# Altium footprint library My Footprint 3D.PCBLIB: 447 footprints (part 29 of 29)
Each footprint in its own frame and in the unit in brackets; x right, y up, seen from the top. Pads: shape width x height; smd on the part's side, far side on the other; paste and mask are expansions set on the pad; w line width, h text height; cw(c..) or ccw(c..) is an arc to the next point about the centre after c.
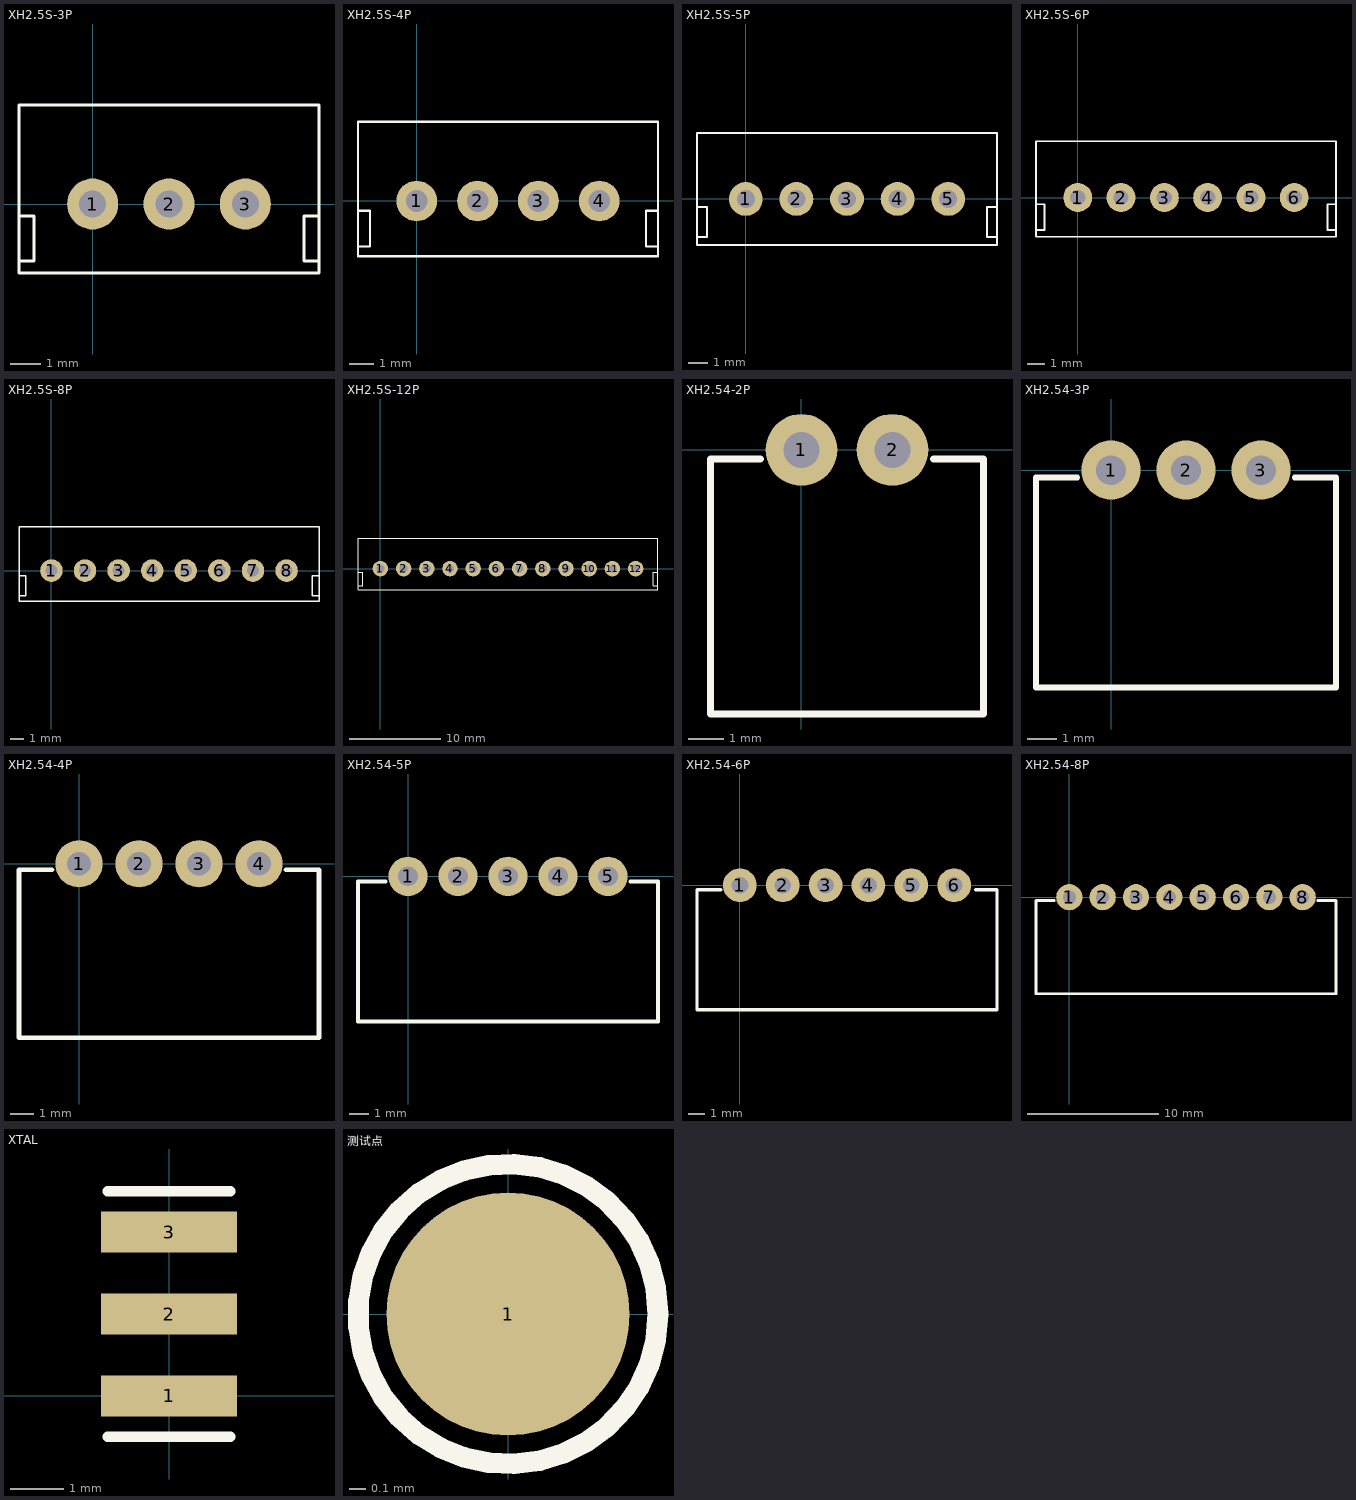
[diagram p28: the footprints below, top view; thin cyan lines are the x and y axes]

## XH2.5S-3P [mm]
pads (3):
  round 1.7 hole 0.9: 1(0,0) 2(2.54,0) 3(5.08,0)
Top Overlay:
  lines w0.1: -2.45,-1.9 -1.95,-1.9 -1.95,-0.4 -2.45,-0.4 ; 7.53,-1.9 7.03,-1.9 7.03,-0.4 7.53,-0.4 ; -2.45,-2.3 -2.45,3.3 7.53,3.3 7.53,-2.3 -2.45,-2.3
3D body: height 7, standoff 0, extent 7.055,-0.45 7.755,3.55
3D body: height 7, standoff 0, extent 4.465,-2.55 7.755,-1.85
3D body: height 3, standoff 0, extent 7.055,-1.85 7.755,-0.45
3D body: height 7, standoff 0, extent -2.675,-0.45 -1.975,3.55
3D body: height 7, standoff 0, extent -2.675,2.85 7.755,3.55
3D body: height 7, standoff 0, extent -2.675,-2.55 0.615,-1.85
3D body: height 3, standoff 0, extent -2.675,-1.85 -1.975,-0.45
3D body: height 1, standoff 0, extent -2.675,-2.55 7.755,3.55
3D body: height 3, standoff 0, extent 0.615,-2.55 4.465,-1.85
3D body: height 6, standoff -2, extent -0.4,-0.4 0.397,0.398
3D body: height 6, standoff -2, extent 2.14,-0.4 2.937,0.398
3D body: height 6, standoff -2, extent 4.683,-0.399 5.48,0.399

## XH2.5S-4P [mm]
pads (4):
  round 1.7 hole 0.9: 1(0,0) 2(2.54,0) 3(5.08,0) 4(7.62,0)
Top Overlay:
  lines w0.1: -2.45,-1.9 -1.95,-1.9 -1.95,-0.4 -2.45,-0.4 ; 10.07,-1.9 9.57,-1.9 9.57,-0.4 10.07,-0.4 ; -2.45,-2.3 10.07,-2.3 10.07,3.3 -2.45,3.3 -2.45,-2.3
3D body: height 3, standoff 0, extent 1.885,-2.55 5.735,-1.85
3D body: height 1, standoff 0, extent -2.675,-2.55 10.295,3.55
3D body: height 3, standoff 0, extent 9.595,-1.85 10.295,-0.45
3D body: height 7, standoff 0, extent 5.735,-2.55 10.295,-1.85
3D body: height 7, standoff 0, extent 9.595,-0.45 10.295,3.55
3D body: height 3, standoff 0, extent -2.675,-1.85 -1.975,-0.45
3D body: height 7, standoff 0, extent -2.675,-2.55 1.885,-1.85
3D body: height 7, standoff 0, extent -2.675,2.85 10.295,3.55
3D body: height 7, standoff 0, extent -2.675,-0.45 -1.975,3.55
3D body: height 6, standoff -2, extent -0.4,-0.4 0.397,0.398
3D body: height 6, standoff -2, extent 2.14,-0.4 2.937,0.398
3D body: height 6, standoff -2, extent 4.68,-0.4 5.477,0.398
3D body: height 6, standoff -2, extent 7.22,-0.4 8.017,0.398

## XH2.5S-5P [mm]
pads (5):
  round 1.7 hole 0.9: 1(0,0) 2(2.54,0) 3(5.08,0) 4(7.62,0) 5(10.16,0)
Top Overlay:
  lines w0.1: -2.45,-1.9 -1.95,-1.9 -1.95,-0.4 -2.45,-0.4 ; 12.61,-1.9 12.11,-1.9 12.11,-0.4 12.61,-0.4 ; -2.45,-2.3 -2.45,3.3 12.61,3.3 12.61,-2.3 -2.45,-2.3
3D body: height 7, standoff 0, extent 12.135,-0.45 12.835,3.55
3D body: height 3, standoff 0, extent 12.135,-1.85 12.835,-0.45
3D body: height 7, standoff 0, extent 7.005,-2.55 12.835,-1.85
3D body: height 3, standoff 0, extent 3.155,-2.55 7.005,-1.85
3D body: height 3, standoff 0, extent -2.675,-1.85 -1.975,-0.45
3D body: height 7, standoff 0, extent -2.675,-2.55 3.155,-1.85
3D body: height 1, standoff 0, extent -2.675,-2.55 12.835,3.55
3D body: height 7, standoff 0, extent -2.675,2.85 12.835,3.55
3D body: height 7, standoff 0, extent -2.675,-0.45 -1.975,3.55
3D body: height 6, standoff -2, extent 9.76,-0.4 10.557,0.398
3D body: height 6, standoff -2, extent 7.22,-0.4 8.017,0.398
3D body: height 6, standoff -2, extent 4.68,-0.4 5.477,0.398
3D body: height 6, standoff -2, extent 2.14,-0.4 2.937,0.398
3D body: height 6, standoff -2, extent -0.4,-0.4 0.397,0.398

## XH2.5S-6P [mm]
pads (6):
  round 1.7 hole 0.9: 1(0,0) 2(2.54,0) 3(5.08,0) 4(7.62,0) 5(10.16,0) 6(12.7,0)
Top Overlay:
  lines w0.1: -2.45,-1.9 -1.95,-1.9 -1.95,-0.4 -2.45,-0.4 ; 15.15,-1.9 14.65,-1.9 14.65,-0.4 15.15,-0.4 ; -2.45,-2.3 15.15,-2.3 15.15,3.3 -2.45,3.3 -2.45,-2.3
3D body: height 7, standoff 0, extent 14.675,-0.45 15.375,3.55
3D body: height 3, standoff 0, extent 14.675,-1.85 15.375,-0.45
3D body: height 6, standoff -2, extent -0.4,-0.4 0.397,0.398
3D body: height 6, standoff -2, extent 2.14,-0.4 2.937,0.398
3D body: height 6, standoff -2, extent 4.68,-0.4 5.477,0.398
3D body: height 6, standoff -2, extent 7.22,-0.4 8.017,0.398
3D body: height 6, standoff -2, extent 9.76,-0.4 10.557,0.398
3D body: height 6, standoff -2, extent 12.3,-0.4 13.097,0.398
3D body: height 7, standoff 0, extent -2.675,-0.45 -1.975,3.55
3D body: height 7, standoff 0, extent -2.675,2.85 15.375,3.55
3D body: height 1, standoff 0, extent -2.675,-2.55 15.375,3.55
3D body: height 7, standoff 0, extent -2.675,-2.55 4.525,-1.85
3D body: height 7, standoff 0, extent 8.175,-2.55 15.375,-1.85
3D body: height 3, standoff 0, extent 4.525,-2.55 8.175,-1.85
3D body: height 3, standoff 0, extent -2.675,-1.85 -1.975,-0.45

## XH2.5S-8P [mm]
pads (8):
  round 1.7 hole 0.9: 1(0,0) 2(2.54,0) 3(5.08,0) 4(7.62,0) 5(10.16,0) 6(12.7,0) 7(15.24,0) 8(17.78,0)
Top Overlay:
  lines w0.1: -2.45,-1.9 -1.95,-1.9 -1.95,-0.4 -2.45,-0.4 ; 20.23,-1.9 19.73,-1.9 19.73,-0.4 20.23,-0.4 ; -2.45,-2.3 20.23,-2.3 20.23,3.3 -2.45,3.3 -2.45,-2.3
3D body: height 7, standoff 0, extent -2.675,-2.55 7.065,-1.85
3D body: height 3, standoff 0, extent 7.065,-2.55 10.715,-1.85
3D body: height 7, standoff 0, extent 10.715,-2.55 20.455,-1.85
3D body: height 7, standoff 0, extent -2.675,-0.45 -1.975,3.55
3D body: height 3, standoff 0, extent -2.675,-1.85 -1.975,-0.45
3D body: height 7, standoff 0, extent 19.755,-0.45 20.455,3.55
3D body: height 3, standoff 0, extent 19.755,-1.85 20.455,-0.45
3D body: height 1, standoff 0, extent -2.675,-2.55 20.455,3.55
3D body: height 7, standoff 0, extent -2.675,2.85 20.455,3.55
3D body: height 6, standoff -2, extent -0.4,-0.4 0.397,0.398
3D body: height 6, standoff -2, extent 2.14,-0.4 2.937,0.398
3D body: height 6, standoff -2, extent 4.68,-0.4 5.477,0.398
3D body: height 6, standoff -2, extent 7.22,-0.4 8.017,0.398
3D body: height 6, standoff -2, extent 9.76,-0.4 10.557,0.398
3D body: height 6, standoff -2, extent 12.3,-0.4 13.097,0.398
3D body: height 6, standoff -2, extent 14.84,-0.4 15.637,0.398
3D body: height 6, standoff -2, extent 17.38,-0.4 18.177,0.398

## XH2.5S-12P [mm]
pads (12):
  round 1.7 hole 0.9: 1(0,0) 2(2.54,0) 3(5.08,0) 4(7.62,0) 5(10.16,0) 6(12.7,0) 7(15.24,0) 8(17.78,0) 9(20.32,0) 10(22.86,0) 11(25.4,0) 12(27.94,0)
Top Overlay:
  lines w0.1: -2.45,-1.9 -1.95,-1.9 -1.95,-0.4 -2.45,-0.4 ; 7.71,-2.3 30.39,-2.3 30.39,3.3 7.71,3.3 ; 20.23,-2.3 -2.45,-2.3 -2.45,3.3 20.23,3.3 ; 30.39,-1.9 29.89,-1.9 29.89,-0.4 30.39,-0.4
3D body: height 6, standoff -3, extent 27.64,-0.3 28.24,0.3
3D body: height 6, standoff -3, extent 25.1,-0.3 25.7,0.3
3D body: height 6, standoff -3, extent 22.56,-0.3 23.16,0.3
3D body: height 6, standoff -3, extent 20.02,-0.3 20.62,0.3
3D body: height 6, standoff -3, extent 17.48,-0.3 18.08,0.3
3D body: height 6, standoff -3, extent 14.94,-0.3 15.54,0.3
3D body: height 6, standoff -3, extent 12.4,-0.3 13,0.3
3D body: height 6, standoff -3, extent 9.86,-0.3 10.46,0.3
3D body: height 6, standoff -3, extent 7.32,-0.3 7.92,0.3
3D body: height 6, standoff -3, extent 4.78,-0.3 5.38,0.3
3D body: height 6, standoff -3, extent 2.24,-0.3 2.84,0.3
3D body: height 6, standoff -3, extent -0.3,-0.3 0.3,0.3
3D body: height 7, standoff 0, extent 28.662,-2.549 30.612,-1.849
3D body: height 3, standoff 0, extent 27.162,-2.549 28.662,-1.849
3D body: height 3, standoff 0, extent -0.725,-2.55 0.775,-1.85
3D body: height 7, standoff 0, extent 29.915,-0.45 30.615,3.55
3D body: height 3, standoff 0, extent 29.915,-1.85 30.615,-0.45
3D body: height 7, standoff 0, extent 0.775,-2.55 27.162,-1.849
3D body: height 3, standoff 0, extent -2.675,-1.85 -1.975,-0.45
3D body: height 7, standoff 0, extent -2.675,-2.55 -0.725,-1.85
3D body: height 1, standoff 0, extent -2.675,-2.55 30.618,3.55
3D body: height 7, standoff 0, extent -2.675,2.85 30.615,3.55
3D body: height 7, standoff 0, extent -2.675,-0.45 -1.975,3.55

## XH2.54-2P [mm]
height 6
pads (2):
  round 2 hole 1: 1(0,0) 2(2.54,0)
Top Overlay:
  lines w0.2: -1.143,-0.254 -2.54,-0.254 -2.54,-7.366 5.08,-7.366 5.08,-0.254 3.683,-0.254

## XH2.54-3P [mm]
height 6
pads (3):
  round 2 hole 1: 1(0,0) 2(2.54,0) 3(5.08,0)
Top Overlay:
  lines w0.2: -1.143,-0.254 -2.54,-0.254 -2.54,-7.366 7.62,-7.366 7.62,-0.254 6.223,-0.254

## XH2.54-4P [mm]
height 6
pads (4):
  round 2 hole 1: 1(0,0) 2(2.54,0) 3(5.08,0) 4(7.62,0)
Top Overlay:
  lines w0.2: -1.143,-0.254 -2.54,-0.254 -2.54,-7.366 10.16,-7.366 10.16,-0.254 8.763,-0.254

## XH2.54-5P [mm]
height 6
pads (5):
  round 2 hole 1: 1(0,0) 2(2.54,0) 3(5.08,0) 4(7.62,0) 5(10.16,0)
Top Overlay:
  lines w0.2: -1.143,-0.254 -2.54,-0.254 -2.54,-7.366 12.7,-7.366 12.7,-0.254 11.303,-0.254

## XH2.54-6P [mm]
height 6
pads (6):
  round 2 hole 1: 1(0,0) 2(2.54,0) 3(5.08,0) 4(7.62,0) 5(10.16,0) 6(12.7,0)
Top Overlay:
  lines w0.2: -1.143,-0.254 -2.54,-0.254 -2.54,-7.366 15.24,-7.366 15.24,-0.254 13.97,-0.254

## XH2.54-8P [mm]
pads (8):
  round 2 hole 1: 1(0,0) 2(2.54,0) 3(5.08,0) 4(7.62,0) 5(10.16,0) 6(12.7,0) 7(15.24,0) 8(17.78,0)
Top Overlay:
  lines w0.2: -1.143,-0.254 -2.54,-0.254 -2.54,-7.366 20.32,-7.366 20.32,-0.254 18.923,-0.254

## XTAL [mil] "Body 4.5mmX2.0mm"
height 118.11
pads (3):
  rect 100x30 smd: 1(0,0) 2(0,60) 3(0,120)
Top Overlay:
  lines w7.87: -45,-30.01 45,-30.01 ; -45,149.99 45,149.99

## 测试点 [mm] "Hold size 1mm"
pads (1):
  round 1.5 smd: 1(0,0)
Top Overlay:
  circle w0.127: c0,0 r0.925